# Altium footprint library Metric_SMD.PcbLib: 185 footprints (part 11 of 12)
Each footprint in its own frame and in the unit in brackets; x right, y up, seen from the top. Pads: shape width x height; smd on the part's side, far side on the other; paste and mask are expansions set on the pad; w line width, h text height; cw(c..) or ccw(c..) is an arc to the next point about the centre after c.
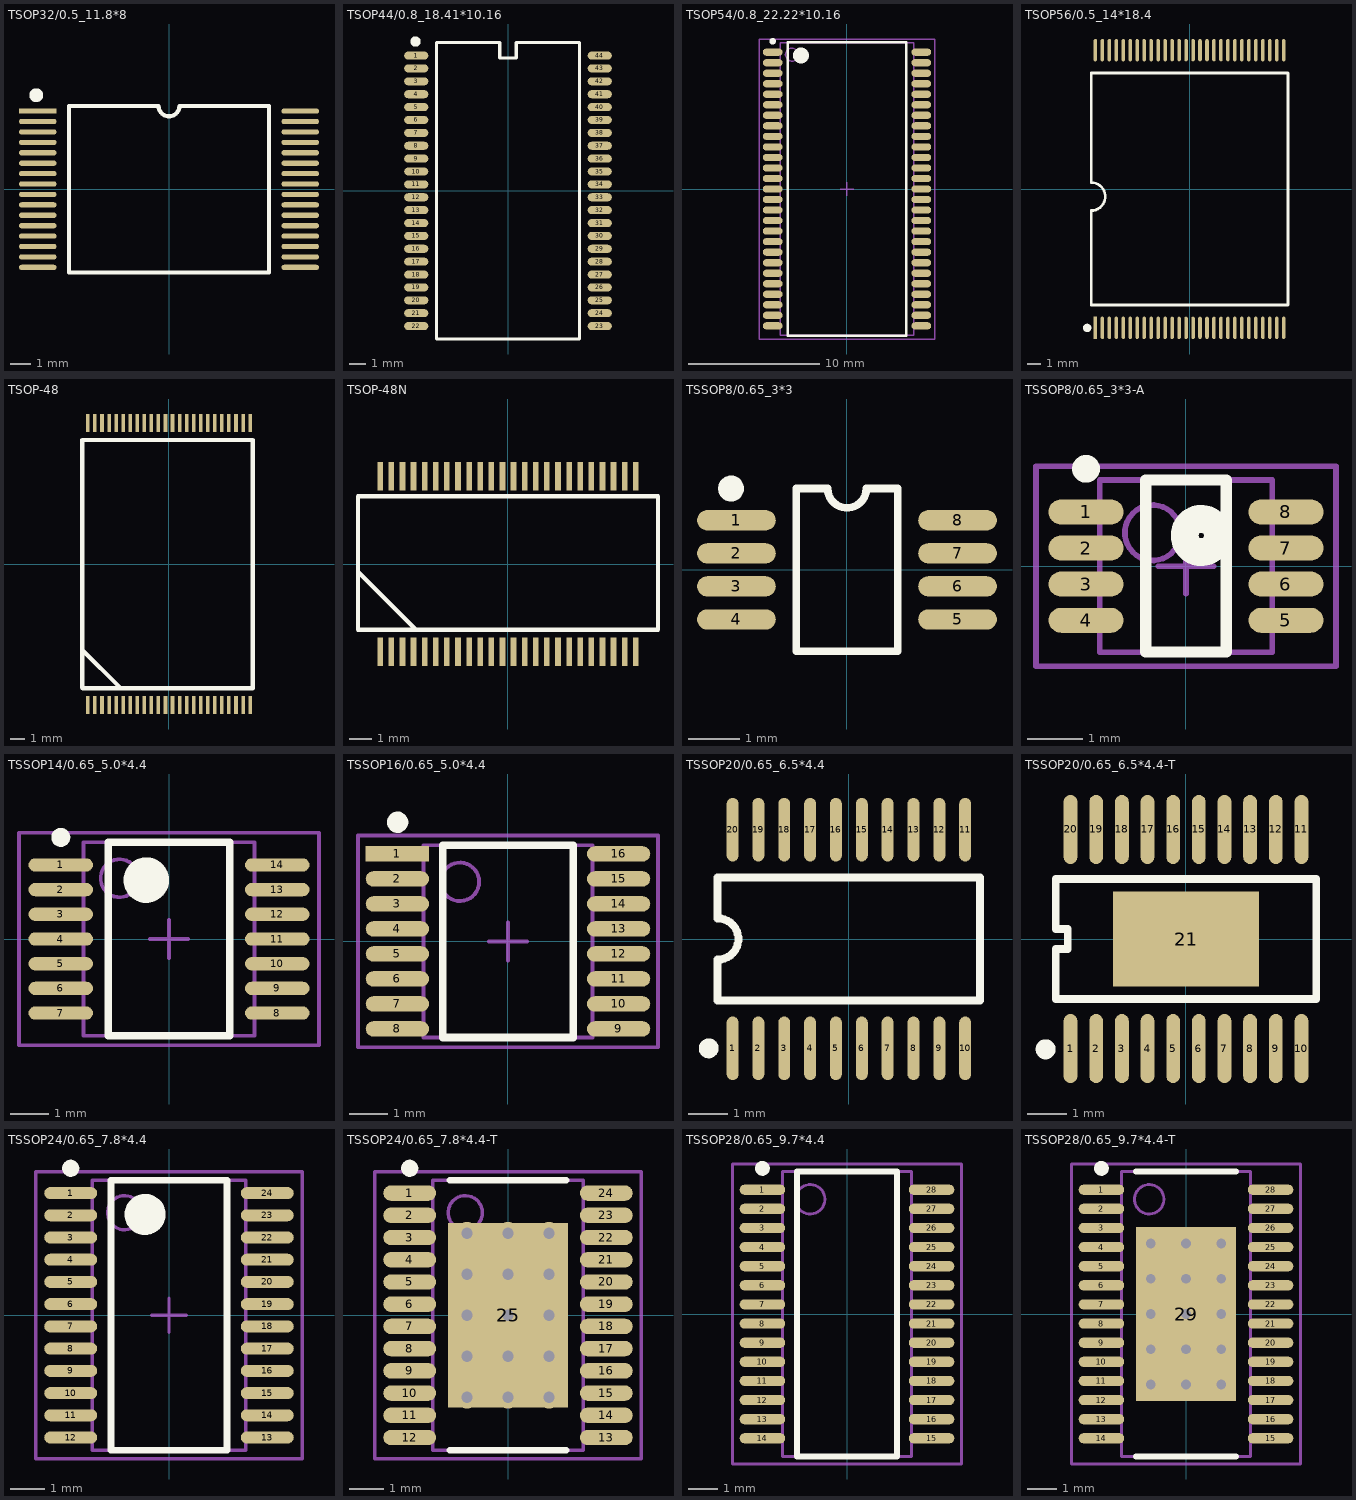
[diagram p10: the footprints below, top view; thin cyan lines are the x and y axes]

## TSOP32/0.5_11.8*8 [mm] "TSOP,32 Leads,Pitch=0.5mm,Body 11.8X8mm"
height 1.2
pads (32):
  rect 1.8x0.25 smd: 1(-6.3,3.75)
  oval 1.8x0.25 smd: 2(-6.3,3.25) 3(-6.3,2.75) 4(-6.3,2.25) 5(-6.3,1.75) 6(-6.3,1.25) 7(-6.3,0.75) 8(-6.3,0.25) 9(-6.3,-0.25) 10(-6.3,-0.75) 11(-6.3,-1.25) 12(-6.3,-1.75) 13(-6.3,-2.25) 14(-6.3,-2.75) 15(-6.3,-3.25) 16(-6.3,-3.75) 17(6.3,-3.75) 18(6.3,-3.25) 19(6.3,-2.75) 20(6.3,-2.25) 21(6.3,-1.75) 22(6.3,-1.25) 23(6.3,-0.75) 24(6.3,-0.25) 25(6.3,0.25) 26(6.3,0.75) 27(6.3,1.25) 28(6.3,1.75) 29(6.3,2.25) 30(6.3,2.75) 31(6.3,3.25) 32(6.3,3.75)
Top Overlay:
  circle w0.35: c-6.373,4.512 r0.16
  lines w0.2: -4.8,-4 -4.8,4 -0.5,4 ccw(c0,4) 0.5,4 4.8,4 4.8,-4 -4.8,-4

## TSOP44/0.8_18.41*10.16 [mm] "TSOP-II,44 Leads,Pitch=0.8mm,Body 18.4X10.16mm"
height 1.2
pads (44):
  oval 1.5x0.5 smd: 1(-5.7,8.4) 2(-5.7,7.6) 3(-5.7,6.8) 4(-5.7,6) 5(-5.7,5.2) 6(-5.7,4.4) 7(-5.7,3.6) 8(-5.7,2.8) 9(-5.7,2) 10(-5.7,1.2) 11(-5.7,0.4) 12(-5.7,-0.4) 13(-5.7,-1.2) 14(-5.7,-2) 15(-5.7,-2.8) 16(-5.7,-3.6) 17(-5.7,-4.4) 18(-5.7,-5.2) 19(-5.7,-6) 20(-5.7,-6.8) 21(-5.7,-7.6) 22(-5.7,-8.4) 23(5.7,-8.4) 24(5.7,-7.6) 25(5.7,-6.8) 26(5.7,-6) 27(5.7,-5.2) 28(5.7,-4.4) 29(5.7,-3.6) 30(5.7,-2.8) 31(5.7,-2) 32(5.7,-1.2) 33(5.7,-0.4) 34(5.7,0.4) 35(5.7,1.2) 36(5.7,2) 37(5.7,2.8) 38(5.7,3.6) 39(5.7,4.4) 40(5.7,5.2) 41(5.7,6) 42(5.7,6.8) 43(5.7,7.6) 44(5.7,8.4)
Top Overlay:
  circle w0.32: c-5.748,9.271 r0.16
  lines w0.2: -4.45,-9.205 4.45,-9.205 4.45,9.205 0.513,9.205 0.513,8.255 -0.512,8.255 -0.512,9.205 -4.45,9.205 -4.45,-9.205
3D body: height 0.8, standoff 0, extent -4.95,-9.1 4.95,9.2

## TSOP54/0.8_22.22*10.16 [mm] "TSOP-II,54 Leads,Pitch=0.8mm,Body 22.22X10.16mm"
height 1.2
pads (54):
  oval 1.5x0.55 smd: 1(-5.65,10.4) 2(-5.65,9.6) 3(-5.65,8.8) 4(-5.65,8) 5(-5.65,7.2) 6(-5.65,6.4) 7(-5.65,5.6) 8(-5.65,4.8) 9(-5.65,4) 10(-5.65,3.2) 11(-5.65,2.4) 12(-5.65,1.6) 13(-5.65,0.8) 14(-5.65,0) 15(-5.65,-0.8) 16(-5.65,-1.6) 17(-5.65,-2.4) 18(-5.65,-3.2) 19(-5.65,-4) 20(-5.65,-4.8) 21(-5.65,-5.6) 22(-5.65,-6.4) 23(-5.65,-7.2) 24(-5.65,-8) 25(-5.65,-8.8) 26(-5.65,-9.6) 27(-5.65,-10.4) 28(5.65,-10.4) 29(5.65,-9.6) 30(5.65,-8.8) 31(5.65,-8) 32(5.65,-7.2) 33(5.65,-6.4) 34(5.65,-5.6) 35(5.65,-4.8) 36(5.65,-4) 37(5.65,-3.2) 38(5.65,-2.4) 39(5.65,-1.6) 40(5.65,-0.8) 41(5.65,0) 42(5.65,0.8) 43(5.65,1.6) 44(5.65,2.4) 45(5.65,3.2) 46(5.65,4) 47(5.65,4.8) 48(5.65,5.6) 49(5.65,6.4) 50(5.65,7.2) 51(5.65,8) 52(5.65,8.8) 53(5.65,9.6) 54(5.65,10.4)
Top Overlay:
  circle w0.6: c-3.5,10.15 r0.3
  circle w0.25: c-5.65,11.225 r0.125
  lines w0.2: -4.5,-11.15 4.5,-11.15 4.5,11.15 -4.5,11.15 -4.5,-11.15
Mechanical 13:
  circle w0.1: c-4.18,10.21 r0.5
  lines w0.1: -5.08,-11.11 5.08,-11.11 5.08,11.11 -5.08,11.11 -5.08,-11.11
Mechanical 15:
  lines w0.1: -0.5,0 0.5,0 ; 0,-0.5 0,0.5 ; -6.65,-11.4 6.65,-11.4 6.65,11.4 -6.65,11.4 -6.65,-11.4
3D body: height 1.2, standoff 0, extent -5.08,-11.11 5.08,11.11

## TSOP56/0.5_14*18.4 [mm] "TSOP,56Leads,Pitch=0.5mm,Body 14X18.4mm"
height 1.2
pads (56):
  rect 0.254x1.6 smd: 1(-6.75,-9.95)
  oval 0.254x1.6 smd: 2(-6.25,-9.95) 3(-5.75,-9.95) 4(-5.25,-9.95) 5(-4.75,-9.95) 6(-4.25,-9.95) 7(-3.75,-9.95) 8(-3.25,-9.95) 9(-2.75,-9.95) 10(-2.25,-9.95) 11(-1.75,-9.95) 12(-1.25,-9.95) 13(-0.75,-9.95) 14(-0.25,-9.95) 15(0.25,-9.95) 16(0.75,-9.95) 17(1.25,-9.95) 18(1.75,-9.95) 19(2.25,-9.95) 20(2.75,-9.95) 21(3.25,-9.95) 22(3.75,-9.95) 23(4.25,-9.95) 24(4.75,-9.95) 25(5.25,-9.95) 26(5.75,-9.95) 27(6.25,-9.95) 28(6.75,-9.95) 29(6.75,9.95) 30(6.25,9.95) 31(5.75,9.95) 32(5.25,9.95) 33(4.75,9.95) 34(4.25,9.95) 35(3.75,9.95) 36(3.25,9.95) 37(2.75,9.95) 38(2.25,9.95) 39(1.75,9.95) 40(1.25,9.95) 41(0.75,9.95) 42(0.25,9.95) 43(-0.25,9.95) 44(-0.75,9.95) 45(-1.25,9.95) 46(-1.75,9.95) 47(-2.25,9.95) 48(-2.75,9.95) 49(-3.25,9.95) 50(-3.75,9.95) 51(-4.25,9.95) 52(-4.75,9.95) 53(-5.25,9.95) 54(-5.75,9.95) 55(-6.25,9.95) 56(-6.75,9.95)
Top Overlay:
  circle w0.3: c-7.338,-9.957 r0.15
  lines w0.2: -7.05,-8.315 7.05,-8.315 7.05,8.315 -7.05,8.315 -7.05,0.466 cw(c-7.05,-0.542) -7.05,-1.55 -7.05,-8.315
3D body: height 0.8, standoff 0.01, extent -7.15,-9.45 7.05,9.25

## TSOP-48 [mm] "间距0.5mm"
height 2
pads (48):
  rect 0.254x1.27 smd: 1(-5.75,-10) 2(-5.25,-10) 3(-4.75,-10) 4(-4.25,-10) 5(-3.75,-10) 6(-3.25,-10) 7(-2.75,-10) 8(-2.25,-10) 9(-1.75,-10) 10(-1.25,-10) 11(-0.75,-10) 12(-0.25,-10) 13(0.25,-10) 14(0.75,-10) 15(1.25,-10) 16(1.75,-10) 17(2.25,-10) 18(2.75,-10) 19(3.25,-10) 20(3.75,-10) 21(4.25,-10) 22(4.75,-10) 23(5.25,-10) 24(5.75,-10) 25(5.75,10) 26(5.25,10) 27(4.75,10) 28(4.25,10) 29(3.75,10) 30(3.25,10) 31(2.75,10) 32(2.25,10) 33(1.75,10) 34(1.25,10) 35(0.75,10) 36(0.25,10) 37(-0.25,10) 38(-0.75,10) 39(-1.25,10) 40(-1.75,10) 41(-2.25,10) 42(-2.75,10) 43(-3.25,10) 44(-3.75,10) 45(-4.25,10) 46(-4.75,10) 47(-5.25,10) 48(-5.75,10)
Top Overlay:
  lines w0.305: -6.15,-8.775 -6.15,8.795 5.947,8.795 5.947,-8.8 -6.125,-8.8 ; -6.15,-6.1 -3.45,-8.8 -3.35,-8.8
3D body: height 1, standoff 0.2, extent -6.15,-9.1 5.95,9.3

## TSOP-48N [mm] "间距0.5mm，窄型8mm宽"
height 1
pads (48):
  rect 0.254x1.27 smd: 1(-5.75,-3.95) 2(-5.25,-3.95) 3(-4.75,-3.95) 4(-4.25,-3.95) 5(-3.75,-3.95) 6(-3.25,-3.95) 7(-2.75,-3.95) 8(-2.25,-3.95) 9(-1.75,-3.95) 10(-1.25,-3.95) 11(-0.75,-3.95) 12(-0.25,-3.95) 13(0.25,-3.95) 14(0.75,-3.95) 15(1.25,-3.95) 16(1.75,-3.95) 17(2.25,-3.95) 18(2.75,-3.95) 19(3.25,-3.95) 20(3.75,-3.95) 21(4.25,-3.95) 22(4.75,-3.95) 23(5.25,-3.95) 24(5.75,-3.95) 25(5.75,3.95) 26(5.25,3.95) 27(4.75,3.95) 28(4.25,3.95) 29(3.75,3.95) 30(3.25,3.95) 31(2.75,3.95) 32(2.25,3.95) 33(1.75,3.95) 34(1.25,3.95) 35(0.75,3.95) 36(0.25,3.95) 37(-0.25,3.95) 38(-0.75,3.95) 39(-1.25,3.95) 40(-1.75,3.95) 41(-2.25,3.95) 42(-2.75,3.95) 43(-3.25,3.95) 44(-3.75,3.95) 45(-4.25,3.95) 46(-4.75,3.95) 47(-5.25,3.95) 48(-5.75,3.95)
Top Overlay:
  lines w0.2: -6.75,-0.35 -4.15,-2.95 -4.05,-2.95 ; -6.75,-2.95 -6.75,3.05 6.75,3.05 6.75,-2.95 -6.75,-2.95
3D body: height 1, standoff 0.1, extent -6.75,-3.55 6.75,3.55

## TSSOP8/0.65_3*3 [mm] "TSSOP,8 PIN,Pitch 0.65mm,Body 3mmX3mm"
height 1.1
pads (8):
  oval 1.55x0.4 smd: 1(-2.175,0.975) 2(-2.175,0.325) 3(-2.175,-0.325) 4(-2.175,-0.975) 5(2.175,-0.975) 6(2.175,-0.325) 7(2.175,0.325) 8(2.175,0.975)
Top Overlay:
  circle w0.25: c-2.28,1.6 r0.13
  lines w0.152: -1,-1.6 -1,1.6 -0.381,1.6 ccw(c0,1.6) 0.381,1.6 1,1.6 1,-1.6 -1,-1.6
3D body "User Library-EMSOP-8 Natl Semi MUY08A.STEP": height 1.04, standoff -0.06, extent -2.5,-1.5 2.5,1.5

## TSSOP8/0.65_3*3-A [mm] "TSSOP, 8-Leads, Body 3x3mm , Pitch 0.65mm, IPC Medium Density"
height 1.1
pads (8):
  oval 1.35x0.45 smd: 1(-1.8,0.975) 2(-1.8,0.325) 3(-1.8,-0.325) 4(-1.8,-0.975) 5(1.8,-0.975) 6(1.8,-0.325) 7(1.8,0.325) 8(1.8,0.975)
Top Overlay:
  circle w0.5: c0.275,0.55 r0.3
  circle w0.25: c-1.8,1.75 r0.125
  lines w0.2: -0.725,-1.55 0.725,-1.55 0.725,1.55 -0.725,1.55 -0.725,-1.55
Mechanical 13:
  circle w0.1: c-0.6,0.6 r0.5
  lines w0.1: -1.55,-1.55 1.55,-1.55 1.55,1.55 -1.55,1.55 -1.55,-1.55
Mechanical 15:
  lines w0.1: -0.5,0 0.5,0 ; 0,-0.5 0,0.5 ; -2.7,-1.8 2.7,-1.8 2.7,1.8 -2.7,1.8 -2.7,-1.8
3D body: height 1.1, standoff 0, extent -1.55,-1.55 1.55,1.55

## TSSOP14/0.65_5.0*4.4 [mm] "TSSOP, 14-Leads, Body 5.1x4.5mm (max), Pitch 0.65mm, IPC Medium Density"
height 1.2
pads (14):
  oval 1.7x0.35 smd: 1(-2.85,1.95) 2(-2.85,1.3) 3(-2.85,0.65) 4(-2.85,0) 5(-2.85,-0.65) 6(-2.85,-1.3) 7(-2.85,-1.95) 8(2.85,-1.95) 9(2.85,-1.3) 10(2.85,-0.65) 11(2.85,0) 12(2.85,0.65) 13(2.85,1.3) 14(2.85,1.95)
Top Overlay:
  circle w0.6: c-0.6,1.55 r0.3
  circle w0.25: c-2.85,2.675 r0.125
  lines w0.2: -1.6,-2.55 1.6,-2.55 1.6,2.55 -1.6,2.55 -1.6,-2.55
Mechanical 13:
  circle w0.1: c-1.3,1.6 r0.5
  lines w0.1: -2.25,-2.55 2.25,-2.55 2.25,2.55 -2.25,2.55 -2.25,-2.55
Mechanical 15:
  lines w0.1: -0.5,0 0.5,0 ; 0,-0.5 0,0.5 ; -3.95,-2.8 3.95,-2.8 3.95,2.8 -3.95,2.8 -3.95,-2.8
3D body "SW3dPS-TSSOP14-1.STEP": height 1.1, standoff 0, extent -3.121,-2.5 3.279,2.5

## TSSOP16/0.65_5.0*4.4 [mm] "TSSOP, 16-Leads, Body 5.0x4.4mm , Pitch 0.65mm, IPC Medium Density"
height 1.2
pads (16):
  rect 1.65x0.4 smd: 1(-2.875,2.275)
  oval 1.65x0.4 smd: 2(-2.875,1.625) 3(-2.875,0.975) 4(-2.875,0.325) 5(-2.875,-0.325) 6(-2.875,-0.975) 7(-2.875,-1.625) 8(-2.875,-2.275) 9(2.875,-2.275) 10(2.875,-1.625) 11(2.875,-0.975) 12(2.875,-0.325) 13(2.875,0.325) 14(2.875,0.975) 15(2.875,1.625) 16(2.875,2.275)
Top Overlay:
  circle w0.3: c-2.87,3.099 r0.127
  lines w0.2: -1.7,-2.5 1.7,-2.5 1.7,2.5 -1.7,2.5 -1.7,-2.5
Mechanical 13:
  circle w0.1: c-1.25,1.55 r0.5
  lines w0.1: -2.2,-2.5 2.2,-2.5 2.2,2.5 -2.2,2.5 -2.2,-2.5
Mechanical 15:
  lines w0.1: -0.5,0 0.5,0 ; 0,-0.5 0,0.5 ; -3.9,-2.75 3.9,-2.75 3.9,2.75 -3.9,2.75 -3.9,-2.75
3D body "User Library-IPC SOSOP65P640X120-16N MO-153AB RU-16.STEP": height 1.35, standoff 0, extent -3.223,-2.574 3.233,2.526

## TSSOP20/0.65_6.5*4.4 [mm] "Thin Shrink Small Outline; 20 Leads; Body Width 4.4 mm; Pitch 0.65 mm"
height 1.1
pads (20):
  oval 0.3x1.6 smd: 1(-2.925,-2.75) 2(-2.275,-2.75) 3(-1.625,-2.75) 4(-0.975,-2.75) 5(-0.325,-2.75) 6(0.325,-2.75) 7(0.975,-2.75) 8(1.625,-2.75) 9(2.275,-2.75) 10(2.925,-2.75) 11(2.925,2.75) 12(2.275,2.75) 13(1.625,2.75) 14(0.975,2.75) 15(0.325,2.75) 16(-0.325,2.75) 17(-0.975,2.75) 18(-1.625,2.75) 19(-2.275,2.75) 20(-2.925,2.75)
Top Overlay:
  circle w0.25: c-3.525,-2.75 r0.125
  lines w0.2: -3.3,-1.55 -3.3,-0.52 ccw(c-3.3,0) -3.3,0.52 -3.3,1.55 3.3,1.55 3.3,-1.55 -3.3,-1.55

## TSSOP20/0.65_6.5*4.4-T [mm] "Power Pad Plastic Small Outline; 20 Leads; Body Width 4.4 mm; Pitch 0.65 mm"
height 1.2
pads (21):
  oval 0.35x1.75 smd: 1(-2.925,-2.775) 2(-2.275,-2.775) 3(-1.625,-2.775) 4(-0.975,-2.775) 5(-0.325,-2.775) 6(0.325,-2.775) 7(0.975,-2.775) 8(1.625,-2.775) 9(2.275,-2.775) 10(2.925,-2.775) 11(2.925,2.775) 12(2.275,2.775) 13(1.625,2.775) 14(0.975,2.775) 15(0.325,2.775) 16(-0.325,2.775) 17(-0.975,2.775) 18(-1.625,2.775) 19(-2.275,2.775) 20(-2.925,2.775)
  rect 3.7x2.4 smd: 21(0,0)
Top Overlay:
  circle w0.254: c-3.556,-2.794 r0.127
  lines w0.2: 3.25,-1.524 -3.3,-1.524 -3.3,-0.256 -2.997,-0.256 -2.997,0.256 -3.3,0.256 -3.3,1.524 3.3,1.524 3.3,-1.524

## TSSOP24/0.65_7.8*4.4 [mm] "TSSOP, 24-Leads, Body 7.9x4.5mm (max), Pitch 0.65mm, IPC Medium Density"
height 1.2
pads (24):
  oval 1.55x0.35 smd: 1(-2.875,3.575) 2(-2.875,2.925) 3(-2.875,2.275) 4(-2.875,1.625) 5(-2.875,0.975) 6(-2.875,0.325) 7(-2.875,-0.325) 8(-2.875,-0.975) 9(-2.875,-1.625) 10(-2.875,-2.275) 11(-2.875,-2.925) 12(-2.875,-3.575) 13(2.875,-3.575) 14(2.875,-2.925) 15(2.875,-2.275) 16(2.875,-1.625) 17(2.875,-0.975) 18(2.875,-0.325) 19(2.875,0.325) 20(2.875,0.975) 21(2.875,1.625) 22(2.875,2.275) 23(2.875,2.925) 24(2.875,3.575)
Top Overlay:
  circle w0.25: c-2.875,4.3 r0.125
  circle w0.6: c-0.7,2.95 r0.3
  lines w0.2: -1.7,-3.95 -1.7,3.95 1.7,3.95 1.7,-3.95 -1.7,-3.95
Mechanical 13:
  circle w0.1: c-1.3,3 r0.5
  lines w0.1: -2.25,-3.95 -2.25,3.95 2.25,3.95 2.25,-3.95 -2.25,-3.95
Mechanical 15:
  lines w0.1: -0.5,0 0.5,0 ; 0,-0.5 0,0.5 ; -3.9,-4.2 -3.9,4.2 3.9,4.2 3.9,-4.2 -3.9,-4.2
3D body: height 1.2, standoff 0.05, extent -2.25,-3.95 2.25,3.95

## TSSOP24/0.65_7.8*4.4-T [mm] "TSSOP,24 Leads; Body Width 4.4 mm; Pitch 0.65 mm"
height 1.2
pads (25):
  oval 1.55x0.45 smd: 1(-2.875,3.575) 2(-2.875,2.925) 3(-2.875,2.275) 4(-2.875,1.625) 5(-2.875,0.975) 6(-2.875,0.325) 7(-2.875,-0.325) 8(-2.875,-0.975) 9(-2.875,-1.625) 10(-2.875,-2.275) 11(-2.875,-2.925) 12(-2.875,-3.575) 13(2.875,-3.575) 14(2.875,-2.925) 15(2.875,-2.275) 16(2.875,-1.625) 17(2.875,-0.975) 18(2.875,-0.325) 19(2.875,0.325) 20(2.875,0.975) 21(2.875,1.625) 22(2.875,2.275) 23(2.875,2.925) 24(2.875,3.575)
  rect 3.5x5.4 smd: 25(0,0)
via -1.2,2.4 diameter 0.66 hole 0.33
via 0,2.4 diameter 0.66 hole 0.33
via 1.2,2.4 diameter 0.66 hole 0.33
via -1.2,1.2 diameter 0.66 hole 0.33
via 0,1.2 diameter 0.66 hole 0.33
via 1.2,1.2 diameter 0.66 hole 0.33
via -1.2,0 diameter 0.66 hole 0.33
via 0,0 diameter 0.66 hole 0.33
via 1.2,0 diameter 0.66 hole 0.33
via -1.2,-1.2 diameter 0.66 hole 0.33
via 0,-1.2 diameter 0.66 hole 0.33
via 1.2,-1.2 diameter 0.66 hole 0.33
via -1.2,-2.4 diameter 0.66 hole 0.33
via 0,-2.4 diameter 0.66 hole 0.33
via 1.2,-2.4 diameter 0.66 hole 0.33
Top Overlay:
  circle w0.25: c-2.875,4.3 r0.125
  lines w0.2: -1.7,-3.95 1.7,-3.95 ; -1.7,3.95 1.7,3.95
Mechanical 13:
  circle w0.1: c-1.25,3 r0.5
  lines w0.1: -2.2,-3.95 -2.2,3.95 2.2,3.95 2.2,-3.95 -2.2,-3.95
Mechanical 15:
  lines w0.1: -0.5,0 0.5,0 ; 0,-0.5 0,0.5 ; -3.9,-4.2 -3.9,4.2 3.9,4.2 3.9,-4.2 -3.9,-4.2
3D body "User Library-TSSOP24_(JEDEC_MO-153).STEP": height 1.2, standoff 0, extent -3.33,-3.975 3.226,3.925

## TSSOP28/0.65_9.7*4.4 [mm] "与SSOP28，0.65mm兼容"
height 1.1
pads (28):
  oval 1.55x0.35 smd: 1(-2.875,4.225) 2(-2.875,3.575) 3(-2.875,2.925) 4(-2.875,2.275) 5(-2.875,1.625) 6(-2.875,0.975) 7(-2.875,0.325) 8(-2.875,-0.325) 9(-2.875,-0.975) 10(-2.875,-1.625) 11(-2.875,-2.275) 12(-2.875,-2.925) 13(-2.875,-3.575) 14(-2.875,-4.225) 15(2.875,-4.225) 16(2.875,-3.575) 17(2.875,-2.925) 18(2.875,-2.275) 19(2.875,-1.625) 20(2.875,-0.975) 21(2.875,-0.325) 22(2.875,0.325) 23(2.875,0.975) 24(2.875,1.625) 25(2.875,2.275) 26(2.875,2.925) 27(2.875,3.575) 28(2.875,4.225)
Top Overlay:
  circle w0.25: c-2.875,4.95 r0.125
  lines w0.2: 1.7,4.838 1.7,-4.85 -1.7,-4.85 -1.7,4.85 1.7,4.85
Mechanical 13:
  circle w0.1: c-1.25,3.9 r0.5
  lines w0.1: -2.2,-4.85 -2.2,4.85 2.2,4.85 2.2,-4.85 -2.2,-4.85
Mechanical 15:
  lines w0.1: -3.9,-5.1 -3.9,5.1 3.9,5.1 3.9,-5.1 -3.9,-5.1
3D body: height 1.2, standoff 0.2, extent -2.2,-4.85 2.2,4.85

## TSSOP28/0.65_9.7*4.4-T [mm]
height 1.2
pads (29):
  oval 1.55x0.35 smd: 1(-2.875,4.225) 2(-2.875,3.575) 3(-2.875,2.925) 4(-2.875,2.275) 5(-2.875,1.625) 6(-2.875,0.975) 7(-2.875,0.325) 8(-2.875,-0.325) 9(-2.875,-0.975) 10(-2.875,-1.625) 11(-2.875,-2.275) 12(-2.875,-2.925) 13(-2.875,-3.575) 14(-2.875,-4.225) 15(2.875,-4.225) 16(2.875,-3.575) 17(2.875,-2.925) 18(2.875,-2.275) 19(2.875,-1.625) 20(2.875,-0.975) 21(2.875,-0.325) 22(2.875,0.325) 23(2.875,0.975) 24(2.875,1.625) 25(2.875,2.275) 26(2.875,2.925) 27(2.875,3.575) 28(2.875,4.225)
  rect 3.4x5.9 smd: 29(0,0)
via 1.2,-2.4 diameter 0.66 hole 0.33
via 0,-2.4 diameter 0.66 hole 0.33
via -1.2,-2.4 diameter 0.66 hole 0.33
via 1.2,-1.2 diameter 0.66 hole 0.33
via 0,-1.2 diameter 0.66 hole 0.33
via -1.2,-1.2 diameter 0.66 hole 0.33
via 1.2,0 diameter 0.66 hole 0.33
via 0,0 diameter 0.66 hole 0.33
via -1.2,0 diameter 0.66 hole 0.33
via 1.2,1.2 diameter 0.66 hole 0.33
via 0,1.2 diameter 0.66 hole 0.33
via -1.2,1.2 diameter 0.66 hole 0.33
via 1.2,2.4 diameter 0.66 hole 0.33
via 0,2.4 diameter 0.66 hole 0.33
via -1.2,2.4 diameter 0.66 hole 0.33
Top Overlay:
  circle w0.25: c-2.875,4.95 r0.125
  lines w0.2: -1.7,-4.85 1.7,-4.85 ; -1.7,4.85 1.7,4.85
Mechanical 13:
  circle w0.1: c-1.25,3.9 r0.5
  lines w0.1: -2.2,-4.85 2.2,-4.85 2.2,4.85 -2.2,4.85 -2.2,-4.85
Mechanical 15:
  lines w0.1: -0.5,0 0.5,0 ; 0,-0.5 0,0.5 ; -3.9,-5.1 3.9,-5.1 3.9,5.1 -3.9,5.1 -3.9,-5.1
3D body: height 1.2, standoff 0.2, extent -2.2,-4.85 2.2,4.85